# Altium footprint library ZabugorLib.PcbLib: 89 footprints (part 4 of 6)
Each footprint in its own frame and in the unit in brackets; x right, y up, seen from the top. Pads: shape width x height; smd on the part's side, far side on the other; paste and mask are expansions set on the pad; w line width, h text height; cw(c..) or ccw(c..) is an arc to the next point about the centre after c.
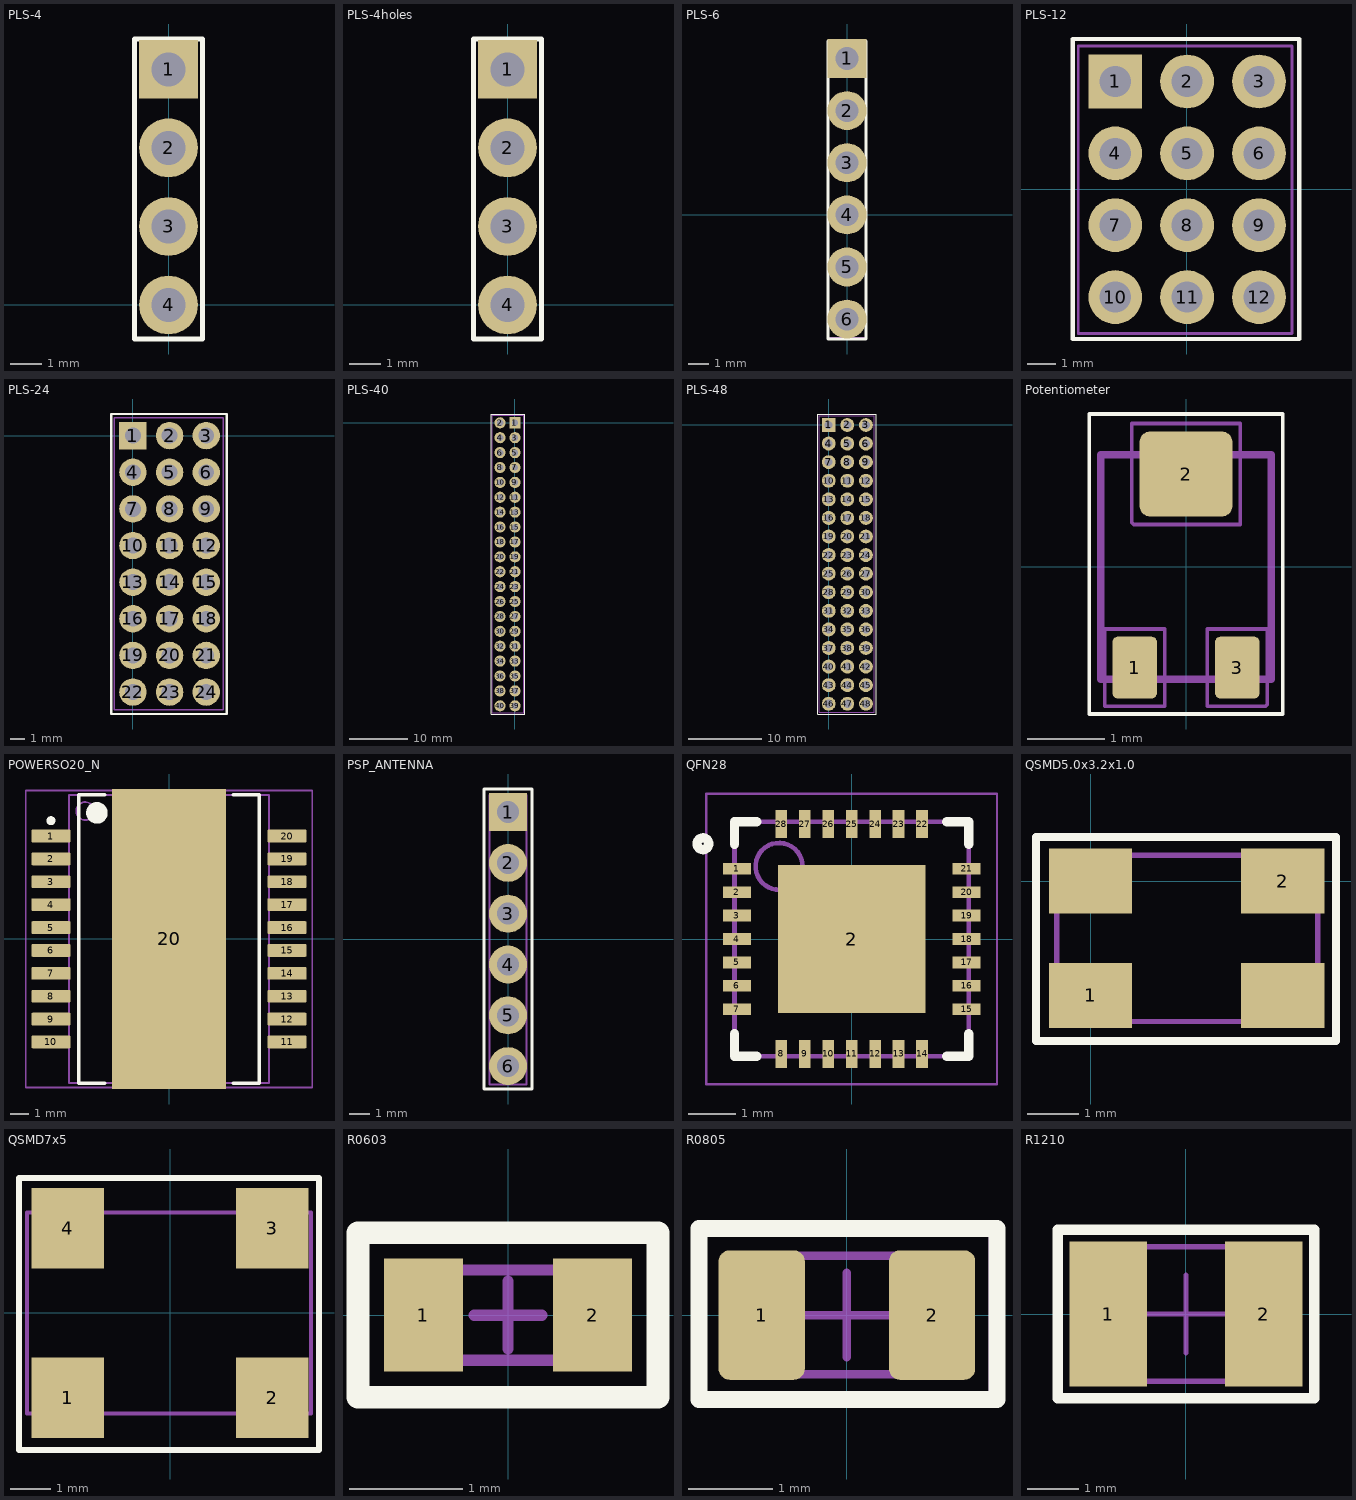
[diagram p3: the footprints below, top view; thin cyan lines are the x and y axes]

## PLS-4 [mm]
height 0.05
pads (4):
  rect 1.9x1.9 hole 1.1: 1(0,7.62)
  round 1.9 hole 1.1: 2(0,5.08) 3(0,2.54)
  round 1.9 hole 1.1 mask+0.102: 4(0,0)
Top Overlay:
  lines w0.15: -1.1,-1.1 -1.1,8.6 1.1,8.6 1.1,-1.1 -1.1,-1.1
Mechanical 7:
  lines w0.1: 0.93,8.58 -1.1,8.58 -1.1,-1.1 1.1,-1.1 ; 1.1,-0.92 1.13,8.38
Mechanical 10:
  text ".Designator" at 1.2,8.4 h0.8
  text ".Comment" at 1.1,-0.3 h0.6
3D body "Pin Header 1x4 TH Pitch 2.54mm.stp": height 9.5, standoff -3.2, extent -1.27,-1.27 1.27,8.89

## PLS-4holes [mm]
height 0.05
pads (4):
  rect 1.9x1.9 hole 1.1: 1(0,7.62)
  round 1.9 hole 1.1: 2(0,5.08) 3(0,2.54)
  round 1.9 hole 1.1 mask+0.102: 4(0,0)
Top Overlay:
  lines w0.15: -1.1,-1.1 1.1,-1.1 1.1,8.6 -1.1,8.6 -1.1,-1.1
Mechanical 7:
  lines w0.1: 0.93,8.58 -1.1,8.58 -1.1,-1.1 1.1,-1.1 ; 1.1,-0.92 1.13,8.38
Mechanical 10:
  text ".Comment" at 1.1,-0.3 h0.6
  text ".Designator" at 1.2,8.4 h0.8

## PLS-6 [mm]
height 0.05
pads (6):
  rect 1.9x1.9 hole 1.1: 1(0,7.62)
  round 1.9 hole 1.1: 2(0,5.08) 3(0,2.54) 5(0,-2.54) 6(0,-5.08)
  round 1.9 hole 1.1 mask+0.102: 4(0,0)
Top Overlay:
  lines w0.15: -0.93,-6.05 0.93,-6.05 0.93,8.48 -0.93,8.48 -0.93,-6.05
Mechanical 7:
  lines w0.1: -0.93,-6 0.93,-6 0.93,8.48 -0.93,8.48 -0.93,-6
Mechanical 10:
  text ".Designator" at 1.2,8.4 h0.8
  text ".Comment" at 1.1,-0.3 h0.6
3D body "User Library-PLS-6.step": height 8.54, standoff -3, extent -1.27,-6.31 1.27,8.93

## PLS-12 [mm]
height 0.05
pads (12):
  rect 1.9x1.9 hole 1.1: 1(-2.525,3.8)
  round 1.9 hole 1.1: 2(0.015,3.8) 3(2.555,3.8) 4(-2.525,1.26) 5(0.015,1.26) 6(2.555,1.26) 7(-2.525,-1.28) 8(0.015,-1.28) 9(2.555,-1.28) 11(0.015,-3.82) 12(2.555,-3.82)
  round 1.9 hole 1.1 mask+0.102: 10(-2.525,-3.82)
Top Overlay:
  lines w0.15: -4.025,-5.3 -4.025,5.3 3.975,5.3 3.975,-5.3 -4.025,-5.3
Mechanical 7:
  lines w0.1: -3.835,-5.1 -3.835,5.05 3.725,5.05 3.725,-5.1 -3.835,-5.1
Mechanical 10:
  text ".Comment" at -1.425,-4.12 h0.6
  text ".Designator" at -1.325,4.58 h0.8
3D body "User Library-PLS-3.step": height 8.54, standoff -3, extent -3.835,2.55 3.785,5.09
3D body "User Library-PLS-3.step": height 8.54, standoff -3, extent -3.835,0.01 3.785,2.55
3D body "User Library-PLS-3.step": height 8.54, standoff -3, extent -3.835,-2.53 3.785,0.01
3D body "User Library-PLS-3.step": height 8.54, standoff -3, extent -3.835,-5.07 3.785,-2.53

## PLS-24 [mm]
height 0.05
pads (24):
  rect 1.9x1.9 hole 1.1: 1(0,0)
  round 1.9 hole 1.1: 2(2.54,0) 3(5.08,0) 4(0,-2.54) 5(2.54,-2.54) 6(5.08,-2.54) 7(0,-5.08) 8(2.54,-5.08) 9(5.08,-5.08) 11(2.54,-7.62) 12(5.08,-7.62) 13(0,-10.16) 14(2.54,-10.16) 15(5.08,-10.16) 16(0,-12.7) 17(2.54,-12.7) 18(5.08,-12.7) 19(0,-15.24) 20(2.54,-15.24) 21(5.08,-15.24) 22(0,-17.78) 23(2.54,-17.78) 24(5.08,-17.78)
  round 1.9 hole 1.1 mask+0.102: 10(0,-7.62)
Top Overlay:
  lines w0.15: -1.5,-19.3 6.5,-19.3 6.5,1.5 -1.5,1.5 -1.5,-19.3
Mechanical 7:
  lines w0.1: -1.31,-19 6.25,-19 6.25,1.25 -1.31,1.25 -1.31,-19
Mechanical 10:
  text ".Designator" at 1.2,0.78 h0.8
  text ".Comment" at 1.1,-7.92 h0.6
3D body "User Library-PLS-3.step": height 8.54, standoff -3, extent -1.31,-11.41 6.31,-8.87
3D body "User Library-PLS-3.step": height 8.54, standoff -3, extent -1.31,-13.95 6.31,-11.41
3D body "User Library-PLS-3.step": height 8.54, standoff -3, extent -1.31,-16.49 6.31,-13.95
3D body "User Library-PLS-3.step": height 8.54, standoff -3, extent -1.31,-19.03 6.31,-16.49
3D body "User Library-PLS-3.step": height 8.54, standoff -3, extent -1.31,-8.87 6.31,-6.33
3D body "User Library-PLS-3.step": height 8.54, standoff -3, extent -1.31,-6.33 6.31,-3.79
3D body "User Library-PLS-3.step": height 8.54, standoff -3, extent -1.31,-3.79 6.31,-1.25
3D body "User Library-PLS-3.step": height 8.54, standoff -3, extent -1.31,-1.25 6.31,1.29

## PLS-40 [mm]
height 0.05
pads (40):
  rect 1.9x1.9 hole 1.1: 1(0,0)
  round 1.9 hole 1.1: 2(-2.54,0) 3(0,-2.54) 4(-2.54,-2.54) 5(0,-5.08) 6(-2.54,-5.08) 8(-2.54,-7.62) 9(0,-10.16) 10(-2.54,-10.16) 11(0,-12.7) 12(-2.54,-12.7) 13(0,-15.24) 14(-2.54,-15.24) 15(0,-17.78) 16(-2.54,-17.78) 19(0,-22.86) 20(-2.54,-22.86) 21(0,-25.4) 22(-2.54,-25.4) 23(0,-27.94) 24(-2.54,-27.94) 25(0,-30.48) 26(-2.54,-30.48) 27(0,-33.02) 28(-2.54,-33.02) 31(0,-38.1) 32(-2.54,-38.1) 33(0,-40.64) 34(-2.54,-40.64) 35(0,-43.18) 36(-2.54,-43.18) 39(0,-48.26) 40(-2.54,-48.26)
  round 1.9 hole 1.1 mask+0.102: 7(0,-7.62) 17(0,-20.32) 18(-2.54,-20.32) 29(0,-35.56) 30(-2.54,-35.56) 37(0,-45.72) 38(-2.54,-45.72)
Top Overlay:
  lines w0.15: -4.04,-49.66 -4.04,1.5 1.66,1.5 1.66,-49.66 -4.04,-49.66
Mechanical 7:
  lines w0.1: -3.85,-49.41 1.46,-49.41 1.46,1.25 -3.85,1.25 -3.85,-49.4
Mechanical 10:
  text ".Designator" at -1.34,0.78 h0.8
  text ".Comment" at -1.44,-7.92 h0.6
3D body "User Library-PLS-2.step": height 8.54, standoff -3, extent -3.78,-1.275 1.3,1.265
3D body "User Library-PLS-2.step": height 8.54, standoff -3, extent -3.78,-3.815 1.3,-1.275
3D body "User Library-PLS-2.step": height 8.54, standoff -3, extent -3.78,-6.355 1.3,-3.815
3D body "User Library-PLS-2.step": height 8.54, standoff -3, extent -3.78,-8.895 1.3,-6.355
3D body "User Library-PLS-2.step": height 8.54, standoff -3, extent -3.78,-11.435 1.3,-8.895
3D body "User Library-PLS-2.step": height 8.54, standoff -3, extent -3.78,-13.975 1.3,-11.435
3D body "User Library-PLS-2.step": height 8.54, standoff -3, extent -3.78,-16.515 1.3,-13.975
3D body "User Library-PLS-2.step": height 8.54, standoff -3, extent -3.78,-19.055 1.3,-16.515
3D body "User Library-PLS-2.step": height 8.54, standoff -3, extent -3.78,-21.595 1.3,-19.055
3D body "User Library-PLS-2.step": height 8.54, standoff -3, extent -3.78,-24.135 1.3,-21.595
3D body "User Library-PLS-2.step": height 8.54, standoff -3, extent -3.78,-26.675 1.3,-24.135
3D body "User Library-PLS-2.step": height 8.54, standoff -3, extent -3.78,-29.215 1.3,-26.675
3D body "User Library-PLS-2.step": height 8.54, standoff -3, extent -3.78,-31.755 1.3,-29.215
3D body "User Library-PLS-2.step": height 8.54, standoff -3, extent -3.78,-34.295 1.3,-31.755
3D body "User Library-PLS-2.step": height 8.54, standoff -3, extent -3.78,-36.835 1.3,-34.295
3D body "User Library-PLS-2.step": height 8.54, standoff -3, extent -3.78,-39.375 1.3,-36.835
3D body "User Library-PLS-2.step": height 8.54, standoff -3, extent -3.78,-41.915 1.3,-39.375
3D body "User Library-PLS-2.step": height 8.54, standoff -3, extent -3.78,-44.455 1.3,-41.915
3D body "User Library-PLS-2.step": height 8.54, standoff -3, extent -3.78,-46.995 1.3,-44.455
3D body "User Library-PLS-2.step": height 8.54, standoff -3, extent -3.78,-49.535 1.3,-46.995

## PLS-48 [mm]
height 0.05
pads (48):
  rect 1.9x1.9 hole 1.1: 1(0,0)
  round 1.9 hole 1.1: 2(2.54,0) 3(5.08,0) 4(0,-2.54) 5(2.54,-2.54) 6(5.08,-2.54) 7(0,-5.08) 8(2.54,-5.08) 9(5.08,-5.08) 11(2.54,-7.62) 12(5.08,-7.62) 13(0,-10.16) 14(2.54,-10.16) 15(5.08,-10.16) 16(0,-12.7) 17(2.54,-12.7) 18(5.08,-12.7) 19(0,-15.24) 20(2.54,-15.24) 21(5.08,-15.24) 22(0,-17.78) 23(2.54,-17.78) 24(5.08,-17.78) 28(0,-22.86) 29(2.54,-22.86) 30(5.08,-22.86) 31(0,-25.4) 32(2.54,-25.4) 33(5.08,-25.4) 34(0,-27.94) 35(2.54,-27.94) 36(5.08,-27.94) 37(0,-30.48) 38(2.54,-30.48) 39(5.08,-30.48) 40(0,-33.02) 41(2.54,-33.02) 42(5.08,-33.02) 46(0,-38.1) 47(2.54,-38.1) 48(5.08,-38.1)
  round 1.9 hole 1.1 mask+0.102: 10(0,-7.62) 25(0,-20.32) 26(2.54,-20.32) 27(5.08,-20.32) 43(0,-35.56) 44(2.54,-35.56) 45(5.08,-35.56)
Top Overlay:
  lines w0.15: -1.5,-39.5 -1.5,1.5 6.5,1.5 6.5,-39.5 -1.5,-39.5
Mechanical 7:
  lines w0.1: -1.31,-39.25 -1.31,1.25 6.25,1.25 6.25,-39.25 -1.31,-39.25
Mechanical 10:
  text ".Comment" at 1.1,-7.92 h0.6
  text ".Designator" at 1.2,0.78 h0.8
3D body "User Library-PLS-3.step": height 8.54, standoff -3, extent -1.31,-1.25 6.31,1.29
3D body "User Library-PLS-3.step": height 8.54, standoff -3, extent -1.31,-3.79 6.31,-1.25
3D body "User Library-PLS-3.step": height 8.54, standoff -3, extent -1.31,-6.33 6.31,-3.79
3D body "User Library-PLS-3.step": height 8.54, standoff -3, extent -1.31,-8.87 6.31,-6.33
3D body "User Library-PLS-3.step": height 8.54, standoff -3, extent -1.31,-11.41 6.31,-8.87
3D body "User Library-PLS-3.step": height 8.54, standoff -3, extent -1.31,-13.95 6.31,-11.41
3D body "User Library-PLS-3.step": height 8.54, standoff -3, extent -1.31,-16.49 6.31,-13.95
3D body "User Library-PLS-3.step": height 8.54, standoff -3, extent -1.31,-19.03 6.31,-16.49
3D body "User Library-PLS-3.step": height 8.54, standoff -3, extent -1.31,-21.57 6.31,-19.03
3D body "User Library-PLS-3.step": height 8.54, standoff -3, extent -1.31,-24.11 6.31,-21.57
3D body "User Library-PLS-3.step": height 8.54, standoff -3, extent -1.31,-26.65 6.31,-24.11
3D body "User Library-PLS-3.step": height 8.54, standoff -3, extent -1.31,-29.19 6.31,-26.65
3D body "User Library-PLS-3.step": height 8.54, standoff -3, extent -1.31,-31.73 6.31,-29.19
3D body "User Library-PLS-3.step": height 8.54, standoff -3, extent -1.31,-34.27 6.31,-31.73
3D body "User Library-PLS-3.step": height 8.54, standoff -3, extent -1.31,-36.81 6.31,-34.27
3D body "User Library-PLS-3.step": height 8.54, standoff -3, extent -1.31,-39.35 6.31,-36.81

## Potentiometer [mm]
height 1.12
pads (3):
  rrect25% 0.575x0.8 smd: 1(-0.663,-1.3) 3(0.663,-1.3)
  rrect25% 1.2x1.1 smd: 2(0,1.2)
Top Overlay:
  lines w0.05: -1.25,-1.9 1.25,-1.9 1.25,1.975 -1.25,1.975 -1.25,-1.9
Mechanical 7:
  lines w0.05: -1.05,-1.8 -1.05,-0.8 -0.275,-0.8 -0.275,-1.8 -1.05,-1.8 ; -0.7,0.575 -0.7,1.45 -0.7,1.85 0.7,1.85 0.7,0.55 -0.675,0.55 -0.7,0.575 ; 0.275,-1.8 0.275,-0.8 1.05,-0.8 1.05,-1.775 1.025,-1.8 0.275,-1.8
Mechanical 9:
  text ".Designator" at 10.287,-3.937 h1
  text ".Comment" at 11.049,-3.175 h0.8
Mechanical 15:
  lines w0.1: -1.1,-1.45 -1.1,1.45 1.1,1.45 1.1,-1.45 -1.1,-1.45
3D body "User Library-3302X-3-103.step": height 1.1, standoff 0, extent -1.1,-1.449 1.1,1.45

## POWERSO20_N [mm] "SOP, 20-Leads, Body 15.9x11mm, Pitch 1.27mm, IPC Medium Density"
height 3.6
pads (21):
  rrect25% 2.19x0.71 smd: 1(-6.55,5.715) 2(-6.55,4.445) 3(-6.55,3.175) 4(-6.55,1.905) 5(-6.55,0.635) 6(-6.55,-0.635) 7(-6.55,-1.905) 8(-6.55,-3.175) 9(-6.55,-4.445) 10(-6.55,-5.715) 11(6.55,-5.715) 12(6.55,-4.445) 13(6.55,-3.175) 14(6.55,-1.905) 15(6.55,-0.635) 16(6.55,0.635) 17(6.55,1.905) 18(6.55,3.175) 19(6.55,4.445) 20(6.55,5.715)
  rect 6.35x16.65 smd paste-5: 20(0,0)
Top Overlay:
  circle w0.25: c-6.55,6.565 r0.125
  circle w0.6: c-4,7 r0.3
  lines w0.2: -3.575,-8 -5,-8 -5,8 -3.575,8 ; 3.575,-8 5,-8 5,8 3.575,8
Top Paste:
  drawing of 170 lines, arcs and shapes, not listed
Mechanical 13:
  circle w0.1: c-4.65,7.1 r0.5
  lines w0.1: -5.55,-8 -5.55,8 5.55,8 5.55,-8 -5.55,-8
Mechanical 15:
  lines w0.1: -0.5,0 0.5,0 ; 0,-0.5 0,0.5 ; -7.95,-8.25 -7.95,8.25 7.95,8.25 7.95,-8.25 -7.95,-8.25
3D body "User Library-PowerSO20.STEP": height 3.6, standoff 0, extent -7.15,-8 7.25,8

## PSP_ANTENNA [mm]
height 0.05
pads (6):
  rect 1.9x1.9 hole 1.1: 1(0,6.345)
  round 1.9 hole 1.1: 2(0,3.805) 3(0,1.265) 5(0,-3.815) 6(0,-6.355)
  round 1.9 hole 1.1 mask+0.102: 4(0,-1.275)
Top Overlay:
  lines w0.15: -1.2,-7.5 1.2,-7.5 1.2,7.5 -1.2,7.5 -1.2,-7.5
Mechanical 7:
  lines w0.1: -0.93,-7.275 0.93,-7.275 0.93,7.205 -0.93,7.205 -0.93,-7.275
Mechanical 10:
  text ".Designator" at 1.2,7.125 h0.8
  text ".Comment" at 1.1,-1.575 h0.6
3D body "PSP_Antenna.STEP": height 54.05, standoff -5.95, extent -2.275,-23.625 22.725,24.375

## QFN28 [mm] "QFN, 28-Leads, Body 5,0x5,0mm (max), Pitch 0,50mm, IPC Medium Density"
height 1
pads (29):
  rect 0.6x0.25 smd: 1(-2.45,1.5) 2(-2.45,1) 3(-2.45,0.5) 4(-2.45,0) 5(-2.45,-0.5) 6(-2.45,-1) 7(-2.45,-1.5) 15(2.45,-1.5) 16(2.45,-1) 17(2.45,-0.5) 18(2.45,0) 19(2.45,0.5) 20(2.45,1) 21(2.45,1.5)
  rect 3.15x3.15 smd: 2(0,0)
  rect 0.25x0.6 smd: 8(-1.5,-2.45) 9(-1,-2.45) 10(-0.5,-2.45) 11(0,-2.45) 12(0.5,-2.45) 13(1,-2.45) 14(1.5,-2.45) 22(1.5,2.45) 23(1,2.45) 24(0.5,2.45) 25(0,2.45) 26(-0.5,2.45) 27(-1,2.45) 28(-1.5,2.45)
Top Overlay:
  circle w0.2: c-3.175,2.032 r0.125
  lines w0.2: -2.5,-2.025 -2.5,-2.5 -2.025,-2.5 ; -2.5,2.025 -2.5,2.5 -2.025,2.5 ; 2.025,-2.5 2.5,-2.5 2.5,-2.025 ; 2.025,2.5 2.5,2.5 2.5,2.025
Mechanical 9:
  text ".Designator" at -1.25,0.25 h1
  text ".Comment" at -1.25,-0.44 h0.8
Mechanical 11:
  circle w0.1: c-1.55,1.55 r0.5
  lines w0.1: -2.5,-2.5 -2.5,2.5 2.5,2.5 2.5,-2.5 -2.5,-2.5
Mechanical 15:
  lines w0.05: -3.1,-3.1 -3.1,3.1 3.1,3.1 3.1,-3.1 -3.1,-3.1
  lines w0.1: -0.5,0 0.5,0 ; 0,-0.5 0,0.5
3D body "User Library-QFN28.step": height 0.9, standoff 0, extent -2.52,-2.52 2.52,2.52

## QSMD5.0x3.2x1.0 [mm] "Кварцевый резонатор KX-9A 8MHz"
height 1.2
pads (4):
  rect 1.6x1.25 smd: 1(0,-2.2) 2(3.7,0) ""(0,0) ""(3.7,-2.2)
Top Overlay:
  lines w0.15: -1.05,-3.075 -1.05,0.85 4.725,0.85 4.725,-3.075 -1.05,-3.075
Mechanical 7:
  lines w0.1: -0.65,-2.7 -0.65,0.5 4.375,0.5 4.375,-2.7 -0.65,-2.7
Mechanical 10:
  text ".Comment" at -0.825,1.85 h0.6
  text ".Designator" at -0.85,2.425 h0.8
3D body "User Library-GeyerElectronics_KX9A.step": height 1.01, standoff 0, extent -0.65,-2.7 4.35,0.5

## QSMD7x5 [mm] "HG-2150CA 1.00MHz"
height 1.2
pads (4):
  rect 1.8x2 smd: 1(-2.54,-2.1) 2(2.54,-2.1) 3(2.54,2.1) 4(-2.54,2.1)
Top Overlay:
  lines w0.15: -3.75,-3.4 -3.75,3.35 3.7,3.35 3.7,-3.4 -3.75,-3.4
Mechanical 7:
  lines w0.1: -3.55,-2.5 -3.55,2.5 3.5,2.5 3.5,-2.5 -3.55,-2.5
Mechanical 10:
  text ".Comment" at -0.825,1.85 h0.6
  text ".Designator" at -0.85,2.425 h0.8
3D body "User Library-CFPS-73.step": height 1.52, standoff 0, extent -3.5,-2.51 3.5,2.51

## R0603 [mm]
height 0.45
pads (2):
  rect 0.7x1 smd: 1(-0.75,0) 2(0.75,0)
Top Overlay:
  lines w0.2: -1.33,-0.73 1.33,-0.73 1.33,0.73 -1.33,0.73 -1.33,-0.73
Mechanical 9:
  text ".Designator" at -1,0 h1
  text ".Comment" at -1,-0.5 h0.8
Mechanical 11:
  lines w0.1: -0.9,-0.4 0.8,-0.4 0.8,0.4 -0.9,0.4 -0.9,-0.4
Mechanical 15:
  lines w0.05: -1.325,-0.725 -1.325,0.75 1.325,0.75 1.325,-0.725 -1.325,-0.725
  lines w0.1: -0.3,0 0.3,0 ; 0,-0.3 0,0.3
3D body "RESC1608.STEP": height 0.5, standoff 0, extent -0.85,-0.4 0.75,0.4

## R0805 [mm] "Chip Resistor, 2-Leads, Body 2,10x1,30mm, IPC Medium Density"
height 0.55
pads (2):
  rrect25% 1.02x1.53 smd paste-5: 1(-1.008,0) 2(1.008,0)
Top Overlay:
  lines w0.2: -1.75,-1 1.775,-1 1.775,1.025 -1.75,1.025 -1.75,-1
Top Paste:
  region: 0.498,-0.64 0.8,0 0.498,0.64 0.498,0.665 0.517,0.711 0.552,0.746 0.598,0.765 0.622,0.765 1.393,0.765 1.417,0.765 1.463,0.746 1.499,0.711 1.518,0.665 1.518,0.64 1.517,-0.64 1.517,-0.665 1.498,-0.711 1.463,-0.746 1.417,-0.765 1.392,-0.765 0.623,-0.765 0.598,-0.765 0.552,-0.746 0.517,-0.711 0.498,-0.665
  region: -0.498,-0.64 -0.8,0 -0.498,0.64 -0.498,0.665 -0.517,0.711 -0.552,0.746 -0.598,0.765 -0.622,0.765 -1.393,0.765 -1.417,0.765 -1.463,0.746 -1.499,0.711 -1.518,0.665 -1.518,0.64 -1.517,-0.64 -1.517,-0.665 -1.498,-0.711 -1.463,-0.746 -1.417,-0.765 -1.392,-0.765 -0.623,-0.765 -0.598,-0.765 -0.552,-0.746 -0.517,-0.711 -0.498,-0.665
Mechanical 9:
  text ".Designator" at -1,0.25 h1
  text ".Comment" at -1,-0.5 h0.8
Mechanical 11:
  lines w0.1: -1.1,-0.7 1.1,-0.7 1.1,0.7 -1.1,0.7 -1.1,-0.7
Mechanical 15:
  lines w0.05: -1.7,-0.95 -1.7,0.95 1.7,0.95 1.7,-0.95 -1.7,-0.95
  lines w0.1: -0.5,0 0.5,0 ; 0,-0.5 0,0.5
3D body: height 0.55, standoff 0, extent 0.7,-0.7 1.1,0.7
3D body: height 0.55, standoff 0, extent -1.1,-0.7 -0.7,0.7
3D body: height 0.55, standoff 0, extent -0.7,-0.7 0.7,0.7

## R1210 [mm]
height 0.55
pads (2):
  rect 1.5x2.8 smd: 1(-1.5,0) 2(1.5,0)
Top Overlay:
  lines w0.2: -2.48,-1.63 2.48,-1.63 2.48,1.63 -2.48,1.63 -2.48,-1.63
Mechanical 7:
  lines w0.1: -1.55,-1.3 -1.55,1.3 1.55,1.3 1.55,-1.3 -1.55,-1.3
Mechanical 9:
  text ".Comment" at -0.75,-0.5 h0.8
  text ".Designator" at -0.75,0.25 h1
Mechanical 11:
  lines w0.1: -1.55,-1.3 -1.55,1.3 1.55,1.3 1.55,-1.3 -1.55,-1.3
Mechanical 15:
  lines w0.05: -2.48,-1.63 -2.48,1.63 2.48,1.63 2.48,-1.63 -2.48,-1.63
  lines w0.1: -0.75,0 0.75,0 ; 0,-0.75 0,0.75
3D body "User Library-R1210.step": height 0.47, standoff 0, extent -1.55,-1.301 1.55,1.301